# Altium integrated library WCAP-AI3H_rev15a.intlib: 26 symbols
Pins are listed as number, name and electrical type; pins without a type are passive.

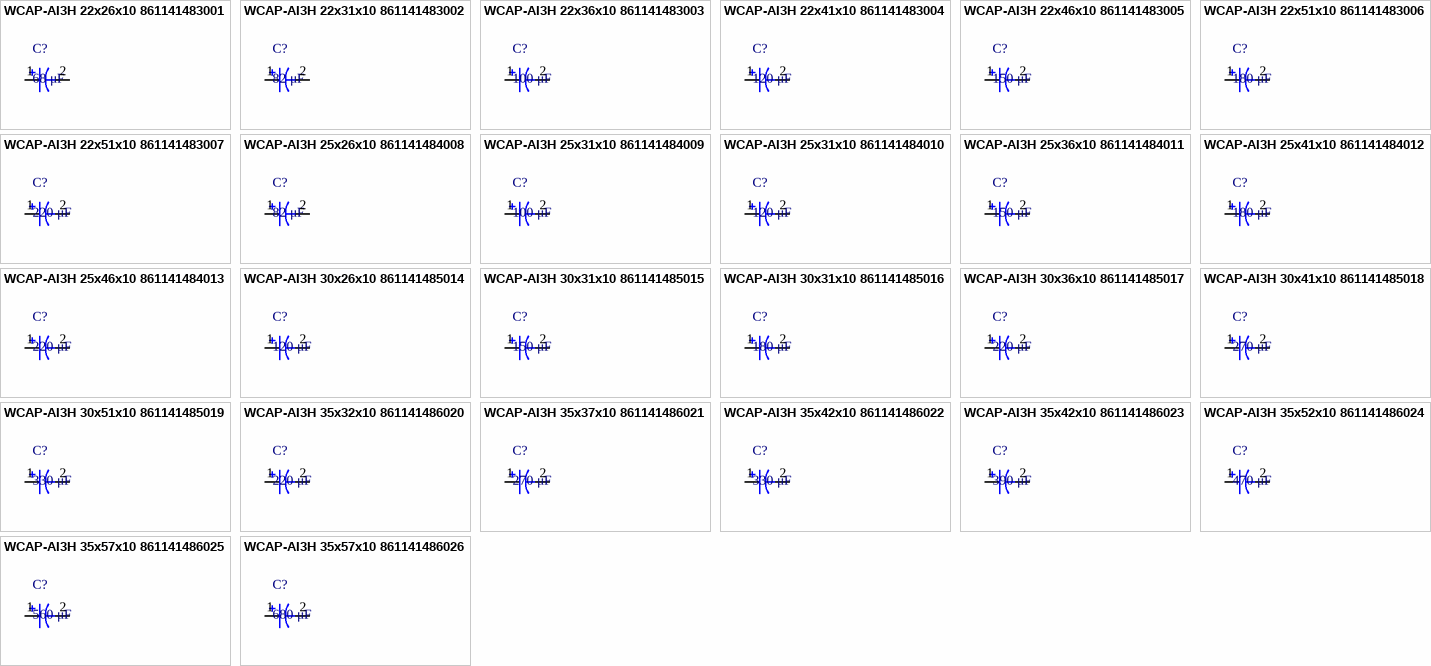
[diagram p0: symbols WCAP-AI3H 22x26x10 861141483001 to WCAP-AI3H 35x57x10 861141486026]

## WCAP-AI3H 22x26x10 861141483001
designator C?, comment 68 μF
WCAP-AI3H Aluminum Electrolytic Capacitors , 68 μF; + / - 20%; 450 V , 22 x 26; Manufacturer: Wurth Elektronik; partNo: 861141483001; E-mail: libraries@we-online.com; Characteristics: Aluminum Electrolytic Capacitor; Recommended soldering: Wave; Operating temperature: –25 °C to +105 °C; Extended lifetime product series; Load life: 3000 h @ +105 °C; ComponentLink1Description: Manufacturer; ComponentLink1URL: http://www.we-online.com; ComponentLink2Description: Datasheet; ComponentLink2URL: http://katalog.we-online.de/pbs/datasheet/861141483001.pdf; Created by: Karrer Zheng; Created Date: 6/8/2015; Capacitance: 68 μF; Application: Medium and high voltage type range from 160V-450V used as primary side input filter in power supply, which can be used in general switching power supply, PC power supply and industrial computer power supply,server power supply, AC-DC converter, motor drive circuit DC storage filter, digital audio, digital TV, communication base station, DC-AC inverter, inverter power supply and converters etc
footprint WCAP-AI3H 22x26x10
pins: 1, 2

## WCAP-AI3H 22x31x10 861141483002
designator C?, comment 82 μF
WCAP-AI3H Aluminum Electrolytic Capacitors , 82 μF; + / - 20%; 450 V , 22 x 31; Manufacturer: Wurth Elektronik; partNo: 861141483002; E-mail: libraries@we-online.com; Characteristics: Aluminum Electrolytic Capacitor; Recommended soldering: Wave; Operating temperature: –25 °C to +105 °C; Extended lifetime product series; Load life: 3000 h @ +105 °C; ComponentLink1Description: Manufacturer; ComponentLink1URL: http://www.we-online.com; ComponentLink2Description: Datasheet; ComponentLink2URL: http://katalog.we-online.de/pbs/datasheet/861141483002.pdf; Created by: Karrer Zheng; Created Date: 6/8/2015; Capacitance: 82 μF; Application: Medium and high voltage type range from 160V-450V used as primary side input filter in power supply, which can be used in general switching power supply, PC power supply and industrial computer power supply,server power supply, AC-DC converter, motor drive circuit DC storage filter, digital audio, digital TV, communication base station, DC-AC inverter, inverter power supply and converters etc
footprint WCAP-AI3H 22x31x10
pins: 1, 2

## WCAP-AI3H 22x36x10 861141483003
designator C?, comment 100 μF
WCAP-AI3H Aluminum Electrolytic Capacitors , 100 μF; + / - 20%; 450 V , 22 x 36; Manufacturer: Wurth Elektronik; partNo: 861141483003; E-mail: libraries@we-online.com; Characteristics: Aluminum Electrolytic Capacitor; Recommended soldering: Wave; Operating temperature: –25 °C to +105 °C; Extended lifetime product series; Load life: 3000 h @ +105 °C; ComponentLink1Description: Manufacturer; ComponentLink1URL: http://www.we-online.com; ComponentLink2Description: Datasheet; ComponentLink2URL: http://katalog.we-online.de/pbs/datasheet/861141483003.pdf; Created by: Karrer Zheng; Created Date: 6/8/2015; Capacitance: 100 μF; Application: Medium and high voltage type range from 160V-450V used as primary side input filter in power supply, which can be used in general switching power supply, PC power supply and industrial computer power supply,server power supply, AC-DC converter, motor drive circuit DC storage filter, digital audio, digital TV, communication base station, DC-AC inverter, inverter power supply and converters etc
footprint WCAP-AI3H 22x36x10
pins: 1, 2

## WCAP-AI3H 22x41x10 861141483004
designator C?, comment 120 μF
WCAP-AI3H Aluminum Electrolytic Capacitors , 120 μF; + / - 20%; 450 V , 22 x 41; Manufacturer: Wurth Elektronik; partNo: 861141483004; E-mail: libraries@we-online.com; Characteristics: Aluminum Electrolytic Capacitor; Recommended soldering: Wave; Operating temperature: –25 °C to +105 °C; Extended lifetime product series; Load life: 3000 h @ +105 °C; ComponentLink1Description: Manufacturer; ComponentLink1URL: http://www.we-online.com; ComponentLink2Description: Datasheet; ComponentLink2URL: http://katalog.we-online.de/pbs/datasheet/861141483004.pdf; Created by: Karrer Zheng; Created Date: 6/8/2015; Capacitance: 120 μF; Application: Medium and high voltage type range from 160V-450V used as primary side input filter in power supply, which can be used in general switching power supply, PC power supply and industrial computer power supply,server power supply, AC-DC converter, motor drive circuit DC storage filter, digital audio, digital TV, communication base station, DC-AC inverter, inverter power supply and converters etc
footprint WCAP-AI3H 22x41x10
pins: 1, 2

## WCAP-AI3H 22x46x10 861141483005
designator C?, comment 150 μF
WCAP-AI3H Aluminum Electrolytic Capacitors , 150 μF; + / - 20%; 450 V , 22 x 46; Manufacturer: Wurth Elektronik; partNo: 861141483005; E-mail: libraries@we-online.com; Characteristics: Aluminum Electrolytic Capacitor; Recommended soldering: Wave; Operating temperature: –25 °C to +105 °C; Extended lifetime product series; Load life: 3000 h @ +105 °C; ComponentLink1Description: Manufacturer; ComponentLink1URL: http://www.we-online.com; ComponentLink2Description: Datasheet; ComponentLink2URL: http://katalog.we-online.de/pbs/datasheet/861141483005.pdf; Created by: Karrer Zheng; Created Date: 6/8/2015; Capacitance: 150 μF; Application: Medium and high voltage type range from 160V-450V used as primary side input filter in power supply, which can be used in general switching power supply, PC power supply and industrial computer power supply,server power supply, AC-DC converter, motor drive circuit DC storage filter, digital audio, digital TV, communication base station, DC-AC inverter, inverter power supply and converters etc
footprint WCAP-AI3H 22x46x10
pins: 1, 2

## WCAP-AI3H 22x51x10 861141483006
designator C?, comment 180 μF
WCAP-AI3H Aluminum Electrolytic Capacitors , 180 μF; + / - 20%; 450 V , 22 x 51; Manufacturer: Wurth Elektronik; partNo: 861141483006; E-mail: libraries@we-online.com; Characteristics: Aluminum Electrolytic Capacitor; Recommended soldering: Wave; Operating temperature: –25 °C to +105 °C; Extended lifetime product series; Load life: 3000 h @ +105 °C; ComponentLink1Description: Manufacturer; ComponentLink1URL: http://www.we-online.com; ComponentLink2Description: Datasheet; ComponentLink2URL: http://katalog.we-online.de/pbs/datasheet/861141483006.pdf; Created by: Karrer Zheng; Created Date: 6/8/2015; Capacitance: 180 μF; Application: Medium and high voltage type range from 160V-450V used as primary side input filter in power supply, which can be used in general switching power supply, PC power supply and industrial computer power supply,server power supply, AC-DC converter, motor drive circuit DC storage filter, digital audio, digital TV, communication base station, DC-AC inverter, inverter power supply and converters etc
footprint WCAP-AI3H 22x51x10
pins: 1, 2

## WCAP-AI3H 22x51x10 861141483007
designator C?, comment 220 μF
WCAP-AI3H Aluminum Electrolytic Capacitors , 220 μF; + / - 20%; 450 V , 22 x 51; Manufacturer: Wurth Elektronik; partNo: 861141483007; E-mail: libraries@we-online.com; Characteristics: Aluminum Electrolytic Capacitor; Recommended soldering: Wave; Operating temperature: –25 °C to +105 °C; Extended lifetime product series; Load life: 3000 h @ +105 °C; ComponentLink1Description: Manufacturer; ComponentLink1URL: http://www.we-online.com; ComponentLink2Description: Datasheet; ComponentLink2URL: http://katalog.we-online.de/pbs/datasheet/861141483007.pdf; Created by: Karrer Zheng; Created Date: 6/8/2015; Capacitance: 220 μF; Application: Medium and high voltage type range from 160V-450V used as primary side input filter in power supply, which can be used in general switching power supply, PC power supply and industrial computer power supply,server power supply, AC-DC converter, motor drive circuit DC storage filter, digital audio, digital TV, communication base station, DC-AC inverter, inverter power supply and converters etc
footprint WCAP-AI3H 22x51x10
pins: 1, 2

## WCAP-AI3H 25x26x10 861141484008
designator C?, comment 82 μF
WCAP-AI3H Aluminum Electrolytic Capacitors , 82 μF; + / - 20%; 450 V , 25 x 26; Manufacturer: Wurth Elektronik; partNo: 861141484008; E-mail: libraries@we-online.com; Characteristics: Aluminum Electrolytic Capacitor; Recommended soldering: Wave; Operating temperature: –25 °C to +105 °C; Extended lifetime product series; Load life: 3000 h @ +105 °C; ComponentLink1Description: Manufacturer; ComponentLink1URL: http://www.we-online.com; ComponentLink2Description: Datasheet; ComponentLink2URL: http://katalog.we-online.de/pbs/datasheet/861141484008.pdf; Created by: Karrer Zheng; Created Date: 6/8/2015; Capacitance: 82 μF; Application: Medium and high voltage type range from 160V-450V used as primary side input filter in power supply, which can be used in general switching power supply, PC power supply and industrial computer power supply,server power supply, AC-DC converter, motor drive circuit DC storage filter, digital audio, digital TV, communication base station, DC-AC inverter, inverter power supply and converters etc
footprint WCAP-AI3H 25x26x10
pins: 1, 2

## WCAP-AI3H 25x31x10 861141484009
designator C?, comment 100 μF
WCAP-AI3H Aluminum Electrolytic Capacitors , 100 μF; + / - 20%; 450 V , 25 x 31; Manufacturer: Wurth Elektronik; partNo: 861141484009; E-mail: libraries@we-online.com; Characteristics: Aluminum Electrolytic Capacitor; Recommended soldering: Wave; Operating temperature: –25 °C to +105 °C; Extended lifetime product series; Load life: 3000 h @ +105 °C; ComponentLink1Description: Manufacturer; ComponentLink1URL: http://www.we-online.com; ComponentLink2Description: Datasheet; ComponentLink2URL: http://katalog.we-online.de/pbs/datasheet/861141484009.pdf; Created by: Karrer Zheng; Created Date: 6/8/2015; Capacitance: 100 μF; Application: Medium and high voltage type range from 160V-450V used as primary side input filter in power supply, which can be used in general switching power supply, PC power supply and industrial computer power supply,server power supply, AC-DC converter, motor drive circuit DC storage filter, digital audio, digital TV, communication base station, DC-AC inverter, inverter power supply and converters etc
footprint WCAP-AI3H 25x31x10
pins: 1, 2

## WCAP-AI3H 25x31x10 861141484010
designator C?, comment 120 μF
WCAP-AI3H Aluminum Electrolytic Capacitors , 120 μF; + / - 20%; 450 V , 25 x 31; Manufacturer: Wurth Elektronik; partNo: 861141484010; E-mail: libraries@we-online.com; Characteristics: Aluminum Electrolytic Capacitor; Recommended soldering: Wave; Operating temperature: –25 °C to +105 °C; Extended lifetime product series; Load life: 3000 h @ +105 °C; ComponentLink1Description: Manufacturer; ComponentLink1URL: http://www.we-online.com; ComponentLink2Description: Datasheet; ComponentLink2URL: http://katalog.we-online.de/pbs/datasheet/861141484010.pdf; Created by: Karrer Zheng; Created Date: 6/8/2015; Capacitance: 120 μF; Application: Medium and high voltage type range from 160V-450V used as primary side input filter in power supply, which can be used in general switching power supply, PC power supply and industrial computer power supply,server power supply, AC-DC converter, motor drive circuit DC storage filter, digital audio, digital TV, communication base station, DC-AC inverter, inverter power supply and converters etc
footprint WCAP-AI3H 25x31x10
pins: 1, 2

## WCAP-AI3H 25x36x10 861141484011
designator C?, comment 150 μF
WCAP-AI3H Aluminum Electrolytic Capacitors , 150 μF; + / - 20%; 450 V , 25 x 36; Manufacturer: Wurth Elektronik; partNo: 861141484011; E-mail: libraries@we-online.com; Characteristics: Aluminum Electrolytic Capacitor; Recommended soldering: Wave; Operating temperature: –25 °C to +105 °C; Extended lifetime product series; Load life: 3000 h @ +105 °C; ComponentLink1Description: Manufacturer; ComponentLink1URL: http://www.we-online.com; ComponentLink2Description: Datasheet; ComponentLink2URL: http://katalog.we-online.de/pbs/datasheet/861141484011.pdf; Created by: Karrer Zheng; Created Date: 6/8/2015; Capacitance: 150 μF; Application: Medium and high voltage type range from 160V-450V used as primary side input filter in power supply, which can be used in general switching power supply, PC power supply and industrial computer power supply,server power supply, AC-DC converter, motor drive circuit DC storage filter, digital audio, digital TV, communication base station, DC-AC inverter, inverter power supply and converters etc
footprint WCAP-AI3H 25x36x10
pins: 1, 2

## WCAP-AI3H 25x41x10 861141484012
designator C?, comment 180 μF
WCAP-AI3H Aluminum Electrolytic Capacitors , 180 μF; + / - 20%; 450 V , 25 x 41; Manufacturer: Wurth Elektronik; partNo: 861141484012; E-mail: libraries@we-online.com; Characteristics: Aluminum Electrolytic Capacitor; Recommended soldering: Wave; Operating temperature: –25 °C to +105 °C; Extended lifetime product series; Load life: 3000 h @ +105 °C; ComponentLink1Description: Manufacturer; ComponentLink1URL: http://www.we-online.com; ComponentLink2Description: Datasheet; ComponentLink2URL: http://katalog.we-online.de/pbs/datasheet/861141484012.pdf; Created by: Karrer Zheng; Created Date: 6/8/2015; Capacitance: 180 μF; Application: Medium and high voltage type range from 160V-450V used as primary side input filter in power supply, which can be used in general switching power supply, PC power supply and industrial computer power supply,server power supply, AC-DC converter, motor drive circuit DC storage filter, digital audio, digital TV, communication base station, DC-AC inverter, inverter power supply and converters etc
footprint WCAP-AI3H 25x41x10
pins: 1, 2

## WCAP-AI3H 25x46x10 861141484013
designator C?, comment 220 μF
WCAP-AI3H Aluminum Electrolytic Capacitors , 220 μF; + / - 20%; 450 V , 25 x 46; Manufacturer: Wurth Elektronik; partNo: 861141484013; E-mail: libraries@we-online.com; Characteristics: Aluminum Electrolytic Capacitor; Recommended soldering: Wave; Operating temperature: –25 °C to +105 °C; Extended lifetime product series; Load life: 3000 h @ +105 °C; ComponentLink1Description: Manufacturer; ComponentLink1URL: http://www.we-online.com; ComponentLink2Description: Datasheet; ComponentLink2URL: http://katalog.we-online.de/pbs/datasheet/861141484013.pdf; Created by: Karrer Zheng; Created Date: 6/8/2015; Capacitance: 220 μF; Application: Medium and high voltage type range from 160V-450V used as primary side input filter in power supply, which can be used in general switching power supply, PC power supply and industrial computer power supply,server power supply, AC-DC converter, motor drive circuit DC storage filter, digital audio, digital TV, communication base station, DC-AC inverter, inverter power supply and converters etc
footprint WCAP-AI3H 25x46x10
pins: 1, 2

## WCAP-AI3H 30x26x10 861141485014
designator C?, comment 120 μF
WCAP-AI3H Aluminum Electrolytic Capacitors , 120 μF; + / - 20%; 450 V , 30 x 26; Manufacturer: Wurth Elektronik; partNo: 861141485014; E-mail: libraries@we-online.com; Characteristics: Aluminum Electrolytic Capacitor; Recommended soldering: Wave; Operating temperature: –25 °C to +105 °C; Extended lifetime product series; Load life: 3000 h @ +105 °C; ComponentLink1Description: Manufacturer; ComponentLink1URL: http://www.we-online.com; ComponentLink2Description: Datasheet; ComponentLink2URL: http://katalog.we-online.de/pbs/datasheet/861141485014.pdf; Created by: Karrer Zheng; Created Date: 6/8/2015; Capacitance: 120 μF; Application: Medium and high voltage type range from 160V-450V used as primary side input filter in power supply, which can be used in general switching power supply, PC power supply and industrial computer power supply,server power supply, AC-DC converter, motor drive circuit DC storage filter, digital audio, digital TV, communication base station, DC-AC inverter, inverter power supply and converters etc
footprint WCAP-AI3H 30x26x10
pins: 1, 2

## WCAP-AI3H 30x31x10 861141485015
designator C?, comment 150 μF
WCAP-AI3H Aluminum Electrolytic Capacitors , 150 μF; + / - 20%; 450 V , 30 x 31; Manufacturer: Wurth Elektronik; partNo: 861141485015; E-mail: libraries@we-online.com; Characteristics: Aluminum Electrolytic Capacitor; Recommended soldering: Wave; Operating temperature: –25 °C to +105 °C; Extended lifetime product series; Load life: 3000 h @ +105 °C; ComponentLink1Description: Manufacturer; ComponentLink1URL: http://www.we-online.com; ComponentLink2Description: Datasheet; ComponentLink2URL: http://katalog.we-online.de/pbs/datasheet/861141485015.pdf; Created by: Karrer Zheng; Created Date: 6/8/2015; Capacitance: 150 μF; Application: Medium and high voltage type range from 160V-450V used as primary side input filter in power supply, which can be used in general switching power supply, PC power supply and industrial computer power supply,server power supply, AC-DC converter, motor drive circuit DC storage filter, digital audio, digital TV, communication base station, DC-AC inverter, inverter power supply and converters etc
footprint WCAP-AI3H 30x31x10
pins: 1, 2

## WCAP-AI3H 30x31x10 861141485016
designator C?, comment 180 μF
WCAP-AI3H Aluminum Electrolytic Capacitors , 180 μF; + / - 20%; 450 V , 30 x 31; Manufacturer: Wurth Elektronik; partNo: 861141485016; E-mail: libraries@we-online.com; Characteristics: Aluminum Electrolytic Capacitor; Recommended soldering: Wave; Operating temperature: –25 °C to +105 °C; Extended lifetime product series; Load life: 3000 h @ +105 °C; ComponentLink1Description: Manufacturer; ComponentLink1URL: http://www.we-online.com; ComponentLink2Description: Datasheet; ComponentLink2URL: http://katalog.we-online.de/pbs/datasheet/861141485016.pdf; Created by: Karrer Zheng; Created Date: 6/8/2015; Capacitance: 180 μF; Application: Medium and high voltage type range from 160V-450V used as primary side input filter in power supply, which can be used in general switching power supply, PC power supply and industrial computer power supply,server power supply, AC-DC converter, motor drive circuit DC storage filter, digital audio, digital TV, communication base station, DC-AC inverter, inverter power supply and converters etc
footprint WCAP-AI3H 30x31x10
pins: 1, 2

## WCAP-AI3H 30x36x10 861141485017
designator C?, comment 220 μF
WCAP-AI3H Aluminum Electrolytic Capacitors , 220 μF; + / - 20%; 450 V , 30 x 36; Manufacturer: Wurth Elektronik; partNo: 861141485017; E-mail: libraries@we-online.com; Characteristics: Aluminum Electrolytic Capacitor; Recommended soldering: Wave; Operating temperature: –25 °C to +105 °C; Extended lifetime product series; Load life: 3000 h @ +105 °C; ComponentLink1Description: Manufacturer; ComponentLink1URL: http://www.we-online.com; ComponentLink2Description: Datasheet; ComponentLink2URL: http://katalog.we-online.de/pbs/datasheet/861141485017.pdf; Created by: Karrer Zheng; Created Date: 6/8/2015; Capacitance: 220 μF; Application: Medium and high voltage type range from 160V-450V used as primary side input filter in power supply, which can be used in general switching power supply, PC power supply and industrial computer power supply,server power supply, AC-DC converter, motor drive circuit DC storage filter, digital audio, digital TV, communication base station, DC-AC inverter, inverter power supply and converters etc
footprint WCAP-AI3H 30x36x10
pins: 1, 2

## WCAP-AI3H 30x41x10 861141485018
designator C?, comment 270 μF
WCAP-AI3H Aluminum Electrolytic Capacitors , 270 μF; + / - 20%; 450 V , 30 x 41; Manufacturer: Wurth Elektronik; partNo: 861141485018; E-mail: libraries@we-online.com; Characteristics: Aluminum Electrolytic Capacitor; Recommended soldering: Wave; Operating temperature: –25 °C to +105 °C; Extended lifetime product series; Load life: 3000 h @ +105 °C; ComponentLink1Description: Manufacturer; ComponentLink1URL: http://www.we-online.com; ComponentLink2Description: Datasheet; ComponentLink2URL: http://katalog.we-online.de/pbs/datasheet/861141485018.pdf; Created by: Karrer Zheng; Created Date: 6/8/2015; Capacitance: 270 μF; Application: Medium and high voltage type range from 160V-450V used as primary side input filter in power supply, which can be used in general switching power supply, PC power supply and industrial computer power supply,server power supply, AC-DC converter, motor drive circuit DC storage filter, digital audio, digital TV, communication base station, DC-AC inverter, inverter power supply and converters etc
footprint WCAP-AI3H 30x41x10
pins: 1, 2

## WCAP-AI3H 30x51x10 861141485019
designator C?, comment 330 μF
WCAP-AI3H Aluminum Electrolytic Capacitors , 330 μF; + / - 20%; 450 V , 30 x 51; Manufacturer: Wurth Elektronik; partNo: 861141485019; E-mail: libraries@we-online.com; Characteristics: Aluminum Electrolytic Capacitor; Recommended soldering: Wave; Operating temperature: –25 °C to +105 °C; Extended lifetime product series; Load life: 3000 h @ +105 °C; ComponentLink1Description: Manufacturer; ComponentLink1URL: http://www.we-online.com; ComponentLink2Description: Datasheet; ComponentLink2URL: http://katalog.we-online.de/pbs/datasheet/861141485019.pdf; Created by: Karrer Zheng; Created Date: 6/8/2015; Capacitance: 330 μF; Application: Medium and high voltage type range from 160V-450V used as primary side input filter in power supply, which can be used in general switching power supply, PC power supply and industrial computer power supply,server power supply, AC-DC converter, motor drive circuit DC storage filter, digital audio, digital TV, communication base station, DC-AC inverter, inverter power supply and converters etc
footprint WCAP-AI3H 30x51x10
pins: 1, 2

## WCAP-AI3H 35x32x10 861141486020
designator C?, comment 220 μF
WCAP-AI3H Aluminum Electrolytic Capacitors , 220 μF; + / - 20%; 450 V , 35 x 32; Manufacturer: Wurth Elektronik; partNo: 861141486020; E-mail: libraries@we-online.com; Characteristics: Aluminum Electrolytic Capacitor; Recommended soldering: Wave; Operating temperature: –25 °C to +105 °C; Extended lifetime product series; Load life: 3000 h @ +105 °C; ComponentLink1Description: Manufacturer; ComponentLink1URL: http://www.we-online.com; ComponentLink2Description: Datasheet; ComponentLink2URL: http://katalog.we-online.de/pbs/datasheet/861141486020.pdf; Created by: Karrer Zheng; Created Date: 6/8/2015; Capacitance: 220 μF; Application: Medium and high voltage type range from 160V-450V used as primary side input filter in power supply, which can be used in general switching power supply, PC power supply and industrial computer power supply,server power supply, AC-DC converter, motor drive circuit DC storage filter, digital audio, digital TV, communication base station, DC-AC inverter, inverter power supply and converters etc
footprint WCAP-AI3H 35x32x10
pins: 1, 2

## WCAP-AI3H 35x37x10 861141486021
designator C?, comment 270 μF
WCAP-AI3H Aluminum Electrolytic Capacitors , 270 μF; + / - 20%; 450 V , 35 x 37; Manufacturer: Wurth Elektronik; partNo: 861141486021; E-mail: libraries@we-online.com; Characteristics: Aluminum Electrolytic Capacitor; Recommended soldering: Wave; Operating temperature: –25 °C to +105 °C; Extended lifetime product series; Load life: 3000 h @ +105 °C; ComponentLink1Description: Manufacturer; ComponentLink1URL: http://www.we-online.com; ComponentLink2Description: Datasheet; ComponentLink2URL: http://katalog.we-online.de/pbs/datasheet/861141486021.pdf; Created by: Karrer Zheng; Created Date: 6/8/2015; Capacitance: 270 μF; Application: Medium and high voltage type range from 160V-450V used as primary side input filter in power supply, which can be used in general switching power supply, PC power supply and industrial computer power supply,server power supply, AC-DC converter, motor drive circuit DC storage filter, digital audio, digital TV, communication base station, DC-AC inverter, inverter power supply and converters etc
footprint WCAP-AI3H 35x37x10
pins: 1, 2

## WCAP-AI3H 35x42x10 861141486022
designator C?, comment 330 μF
WCAP-AI3H Aluminum Electrolytic Capacitors , 330 μF; + / - 20%; 450 V , 35 x 42; Manufacturer: Wurth Elektronik; partNo: 861141486022; E-mail: libraries@we-online.com; Characteristics: Aluminum Electrolytic Capacitor; Recommended soldering: Wave; Operating temperature: –25 °C to +105 °C; Extended lifetime product series; Load life: 3000 h @ +105 °C; ComponentLink1Description: Manufacturer; ComponentLink1URL: http://www.we-online.com; ComponentLink2Description: Datasheet; ComponentLink2URL: http://katalog.we-online.de/pbs/datasheet/861141486022.pdf; Created by: Karrer Zheng; Created Date: 6/8/2015; Capacitance: 330 μF; Application: Medium and high voltage type range from 160V-450V used as primary side input filter in power supply, which can be used in general switching power supply, PC power supply and industrial computer power supply,server power supply, AC-DC converter, motor drive circuit DC storage filter, digital audio, digital TV, communication base station, DC-AC inverter, inverter power supply and converters etc
footprint WCAP-AI3H 35x42x10
pins: 1, 2

## WCAP-AI3H 35x42x10 861141486023
designator C?, comment 390 μF
WCAP-AI3H Aluminum Electrolytic Capacitors , 390 μF; + / - 20%; 450 V , 35 x 42; Manufacturer: Wurth Elektronik; partNo: 861141486023; E-mail: libraries@we-online.com; Characteristics: Aluminum Electrolytic Capacitor; Recommended soldering: Wave; Operating temperature: –25 °C to +105 °C; Extended lifetime product series; Load life: 3000 h @ +105 °C; ComponentLink1Description: Manufacturer; ComponentLink1URL: http://www.we-online.com; ComponentLink2Description: Datasheet; ComponentLink2URL: http://katalog.we-online.de/pbs/datasheet/861141486023.pdf; Created by: Karrer Zheng; Created Date: 6/8/2015; Capacitance: 390 μF; Application: Medium and high voltage type range from 160V-450V used as primary side input filter in power supply, which can be used in general switching power supply, PC power supply and industrial computer power supply,server power supply, AC-DC converter, motor drive circuit DC storage filter, digital audio, digital TV, communication base station, DC-AC inverter, inverter power supply and converters etc
footprint WCAP-AI3H 35x42x10
pins: 1, 2

## WCAP-AI3H 35x52x10 861141486024
designator C?, comment 470 μF
WCAP-AI3H Aluminum Electrolytic Capacitors , 470 μF; + / - 20%; 450 V , 35 x 52; Manufacturer: Wurth Elektronik; partNo: 861141486024; E-mail: libraries@we-online.com; Characteristics: Aluminum Electrolytic Capacitor; Recommended soldering: Wave; Operating temperature: –25 °C to +105 °C; Extended lifetime product series; Load life: 3000 h @ +105 °C; ComponentLink1Description: Manufacturer; ComponentLink1URL: http://www.we-online.com; ComponentLink2Description: Datasheet; ComponentLink2URL: http://katalog.we-online.de/pbs/datasheet/861141486024.pdf; Created by: Karrer Zheng; Created Date: 6/8/2015; Capacitance: 470 μF; Application: Medium and high voltage type range from 160V-450V used as primary side input filter in power supply, which can be used in general switching power supply, PC power supply and industrial computer power supply,server power supply, AC-DC converter, motor drive circuit DC storage filter, digital audio, digital TV, communication base station, DC-AC inverter, inverter power supply and converters etc
footprint WCAP-AI3H 35x52x10
pins: 1, 2

## WCAP-AI3H 35x57x10 861141486025
designator C?, comment 560 μF
WCAP-AI3H Aluminum Electrolytic Capacitors , 560 μF; + / - 20%; 450 V , 35 x 57; Manufacturer: Wurth Elektronik; partNo: 861141486025; E-mail: libraries@we-online.com; Characteristics: Aluminum Electrolytic Capacitor; Recommended soldering: Wave; Operating temperature: –25 °C to +105 °C; Extended lifetime product series; Load life: 3000 h @ +105 °C; ComponentLink1Description: Manufacturer; ComponentLink1URL: http://www.we-online.com; ComponentLink2Description: Datasheet; ComponentLink2URL: http://katalog.we-online.de/pbs/datasheet/861141486025.pdf; Created by: Karrer Zheng; Created Date: 6/8/2015; Capacitance: 560 μF; Application: Medium and high voltage type range from 160V-450V used as primary side input filter in power supply, which can be used in general switching power supply, PC power supply and industrial computer power supply,server power supply, AC-DC converter, motor drive circuit DC storage filter, digital audio, digital TV, communication base station, DC-AC inverter, inverter power supply and converters etc
footprint WCAP-AI3H 35x57x10
pins: 1, 2

## WCAP-AI3H 35x57x10 861141486026
designator C?, comment 680 μF
WCAP-AI3H Aluminum Electrolytic Capacitors , 680 μF; + / - 20%; 450 V , 35 x 57; Manufacturer: Wurth Elektronik; partNo: 861141486026; E-mail: libraries@we-online.com; Characteristics: Aluminum Electrolytic Capacitor; Recommended soldering: Wave; Operating temperature: –25 °C to +105 °C; Extended lifetime product series; Load life: 3000 h @ +105 °C; ComponentLink1Description: Manufacturer; ComponentLink1URL: http://www.we-online.com; ComponentLink2Description: Datasheet; ComponentLink2URL: http://katalog.we-online.de/pbs/datasheet/861141486026.pdf; Created by: Karrer Zheng; Created Date: 6/8/2015; Capacitance: 680 μF; Application: Medium and high voltage type range from 160V-450V used as primary side input filter in power supply, which can be used in general switching power supply, PC power supply and industrial computer power supply,server power supply, AC-DC converter, motor drive circuit DC storage filter, digital audio, digital TV, communication base station, DC-AC inverter, inverter power supply and converters etc
footprint WCAP-AI3H 35x57x10
pins: 1, 2